# Altium footprint library SMT.PcbLib: 379 footprints (part 4 of 24)
Each footprint in its own frame and in the unit in brackets; x right, y up, seen from the top. Pads: shape width x height; smd on the part's side, far side on the other; paste and mask are expansions set on the pad; w line width, h text height; cw(c..) or ccw(c..) is an arc to the next point about the centre after c.
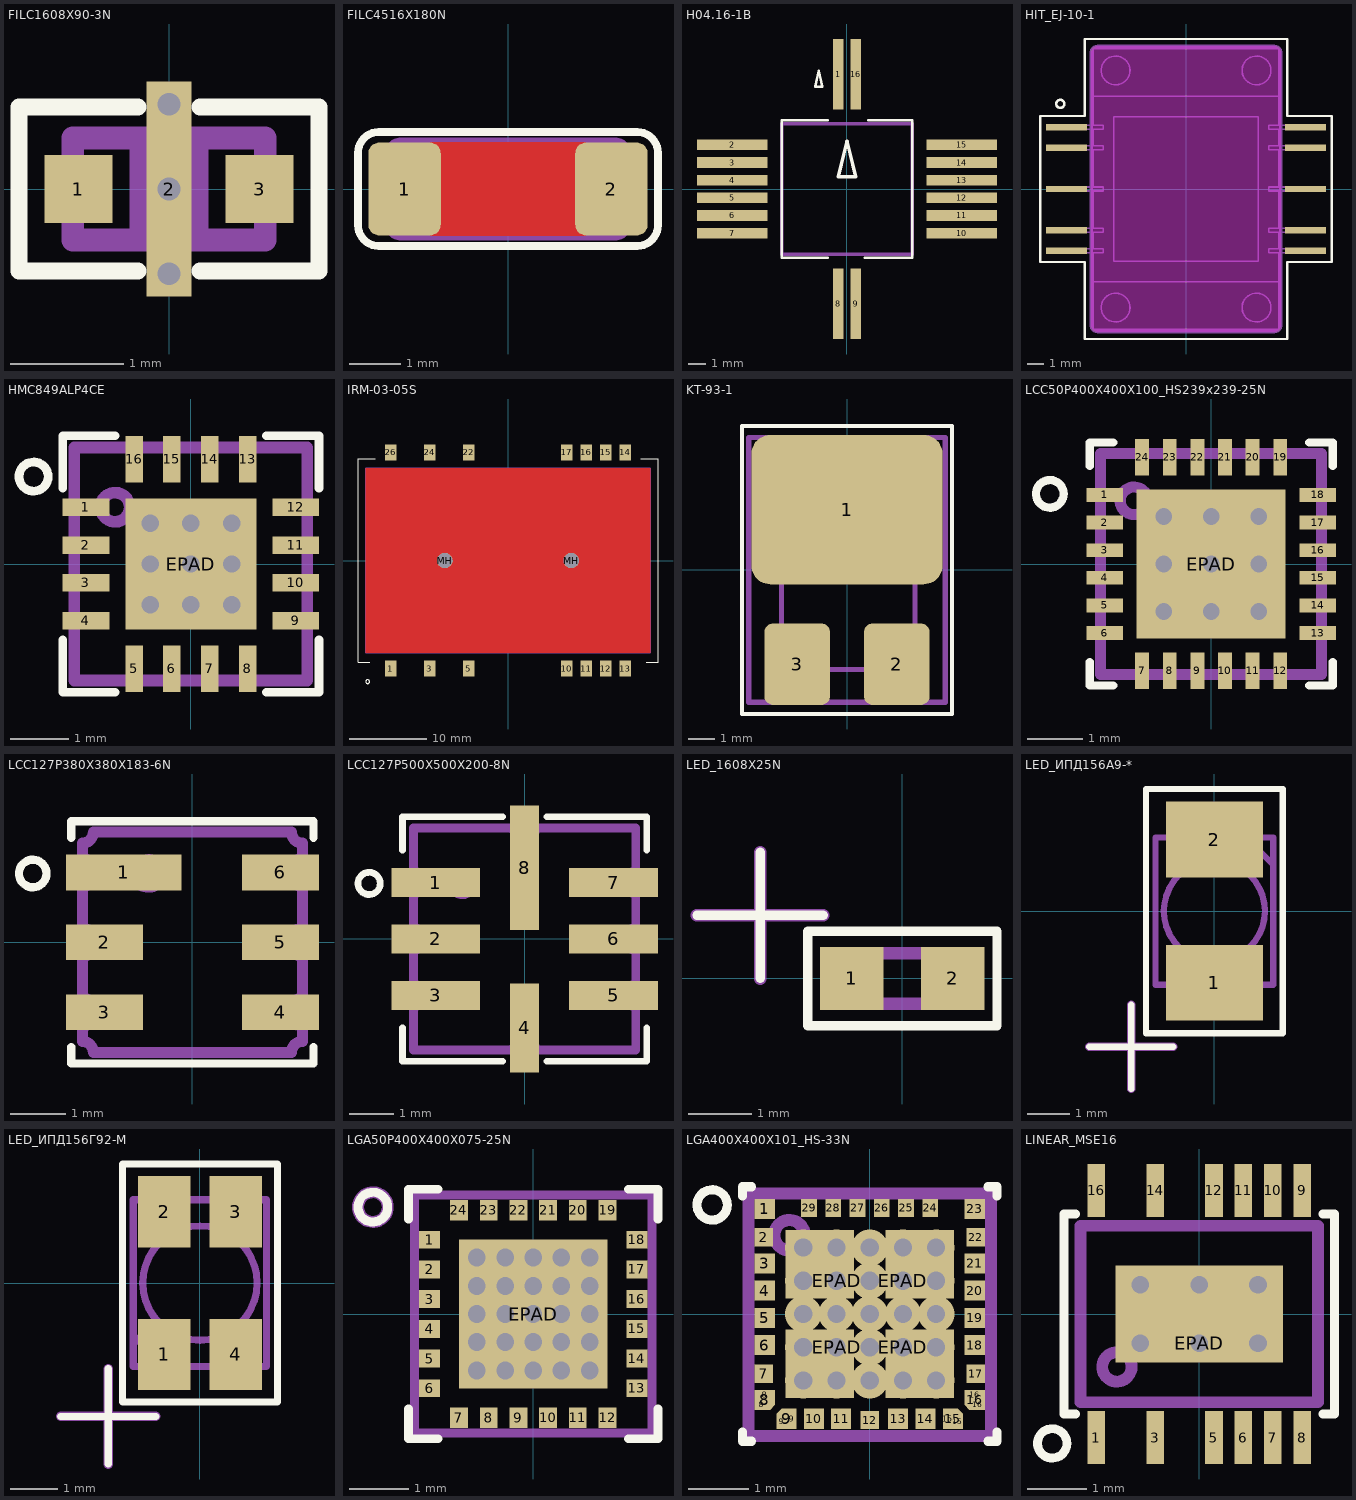
[diagram p3: the footprints below, top view; thin cyan lines are the x and y axes]

## FILC1608X90-3N [mm] "3-Lead SMD (0603); Body: L=1.6mm, W=0.8mm, H=0.9mm; Weight: ~0.01g; Фильтр"
height 0.9
pads (3):
  rect 0.6x0.6 smd paste+0 mask+0.1: 1(-0.8,0) 3(0.8,0)
  rect 0.4x1.9 smd paste-20: 2(0,0)
via 0,0 diameter 0.4 hole 0.2
via 0,0.75 diameter 0.4 hole 0.2
via 0,-0.75 diameter 0.4 hole 0.2
Top Overlay:
  lines w0.15: -0.275,-0.725 -1.325,-0.725 -1.325,0.725 -0.275,0.725 ; 0.275,-0.725 1.325,-0.725 1.325,0.725 0.275,0.725
Top Paste:
  rectangle: -0.2,-0.6 0.2,-0.2
  rectangle: -0.2,0.2 0.2,0.6
Top Solder:
  rectangle: -0.25,-0.6 0.25,-0.2
  rectangle: -0.25,0.2 0.25,0.6
Mechanical 1:
  lines w0.2: -0.25,-0.45 -0.25,0.45 ; 0.25,-0.45 0.25,0.45 ; -0.85,-0.45 0.85,-0.45 0.85,0.45 -0.85,0.45 -0.85,-0.45
3D body "Filter FILC1608X90-3N.stp": height 0.9, standoff 0, extent -0.85,-0.45 0.85,0.45

## FILC4516X180N [mm] "SMD; Body: 4,5x1,6x1,6; Фильтр помехоподавляющий"
height 1.8
pads (2):
  rrect30% 1.4x1.8 smd: 1(-2,0) 2(2,0)
Top Layer:
  pour cut-out: -1.5,0.9 1.5,0.9 1.5,-0.9 -1.5,-0.9
Top Overlay:
  lines w0.15: -2.9,-0.7 ccw(c-2.5,-0.7) -2.5,-1.1 2.5,-1.1 ccw(c2.5,-0.7) 2.9,-0.7 2.9,0.7 ccw(c2.5,0.7) 2.5,1.1 -2.5,1.1 ccw(c-2.5,0.7) -2.9,0.7 -2.9,-0.7
Mechanical 1:
  lines w0.2: -2.3,-0.65 ccw(c-2.05,-0.65) -2.05,-0.9 2.05,-0.9 ccw(c2.05,-0.65) 2.3,-0.65 2.3,0.65 ccw(c2.05,0.65) 2.05,0.9 -2.05,0.9 ccw(c-2.05,0.65) -2.3,0.65 -2.3,-0.65
3D body "Фильтр BLM41P (MuRata).STEP": height 1.6, standoff 0, extent -2.25,-0.8 2.25,0.8

## H04.16-1B [mm]
height 3
pads (16):
  rect 0.6x4 smd: 1(-0.5,6.5) 8(-0.5,-6.5) 9(0.5,-6.5) 16(0.5,6.5)
  rect 4x0.6 smd: 2(-6.5,2.5) 3(-6.5,1.5) 4(-6.5,0.5) 5(-6.5,-0.5) 6(-6.5,-1.5) 7(-6.5,-2.5) 10(6.5,-2.5) 11(6.5,-1.5) 12(6.5,-0.5) 13(6.5,0.5) 14(6.5,1.5) 15(6.5,2.5)
Top Overlay:
  lines w0.15: -1.1,-3.9 -3.7,-3.9 -3.7,3.9 -1.1,3.9 ; 1,-3.9 3.7,-3.9 3.7,3.9 1.2,3.9 ; -1.8,5.8 -1.4,5.8 -1.6,6.7 -1.8,5.8
  lines w0.2: -0.5,0.7 0,2.7 0.5,0.7 -0.5,0.7
Mechanical 1:
  lines w0.2: -3.7,-3.7 -3.7,3.7 3.7,3.7 3.7,-3.7 -3.7,-3.7
3D body "Н04.16-1В.STEP": height 2.93, standoff 0.01, extent -7.84,-8 7.84,8

## HIT_EJ-10-1 [mm] "10-Lead Ceramic Leaded Chip Carrier"
height 3
pads (10):
  rect 2.54x0.4 smd: 1(-7.366,3.81) 2(-7.366,2.54) 3(-7.366,0) 4(-7.366,-2.54) 5(-7.366,-3.81) 6(7.366,-3.81) 7(7.366,-2.54) 8(7.366,0) 9(7.366,2.54) 10(7.366,3.81)
Top Overlay:
  circle w0.15: c-7.75,5.25 r0.25
  lines w0.15: -9,-4.5 -6.25,-4.5 -6.25,-9.25 6.25,-9.25 6.25,-4.5 9,-4.5 9,4.5 6.25,4.5 6.25,9.25 -6.25,9.25 -6.25,4.5 -9,4.5 -9,-4.5
Keep-Out Layer:
  board cut-out: -5.85,-8.4 -5.85,8.4 -5.85,8.48 -5.789,8.627 -5.677,8.739 -5.53,8.8 -5.45,8.8 5.45,8.8 5.53,8.8 5.677,8.739 5.789,8.627 5.85,8.48 5.85,8.4 5.85,-8.4 5.85,-8.48 5.789,-8.627 5.677,-8.739 5.53,-8.8 5.45,-8.8 -5.45,-8.8 -5.53,-8.8 -5.677,-8.739 -5.789,-8.627 -5.85,-8.48
Mechanical 1:
  circle w0.1: c4.345,7.315 r0.889
  circle w0.1: c-4.345,7.315 r0.889
  circle w0.1: c4.345,-7.315 r0.889
  circle w0.1: c-4.345,-7.315 r0.889
  lines w0.1: -5.715,-3.937 -5.715,-5.71 ; -5.715,-3.683 -5.715,-2.667 ; -5.715,-2.413 -5.715,-0.127 ; -5.715,0.127 -5.715,2.413 ; -5.715,2.667 -5.715,3.683 ; -5.715,3.937 -5.715,5.71 ; 5.715,-3.937 5.715,-5.71 ; 5.715,-3.683 5.715,-2.667 ; 5.715,-2.413 5.715,-0.127 ; 5.715,0.127 5.715,2.413 ; 5.715,2.667 5.715,3.683 ; 5.715,3.937 5.715,5.71 ; -5.715,-5.71 -5.715,-8.66 5.715,-8.66 5.715,-5.71 ; -5.715,-5.71 5.715,-5.71 ; -5.715,5.71 -5.715,8.66 5.715,8.66 5.715,5.71 ; -5.715,5.71 5.715,5.71 ; -8.255,-3.937 -5.111,-3.937 -5.111,-3.683 -8.255,-3.683 -8.255,-3.937 ; -8.255,-2.667 -8.255,-2.413 -5.111,-2.413 -5.111,-2.667 -8.255,-2.667 ; -8.255,-0.127 -8.255,0.127 -5.111,0.127 -5.111,-0.127 -8.255,-0.127 ; -8.255,2.413 -5.111,2.413 -5.111,2.667 -8.255,2.667 -8.255,2.413 ; -8.255,3.683 -8.255,3.937 -5.111,3.937 -5.111,3.683 -8.255,3.683 ; -4.45,-4.45 4.45,-4.45 4.45,4.45 -4.45,4.45 -4.45,-4.45 ; 5.111,-3.937 8.255,-3.937 8.255,-3.683 5.111,-3.683 5.111,-3.937 ; 5.111,-2.667 8.255,-2.667 8.255,-2.413 5.111,-2.413 5.111,-2.667 ; 5.111,-0.127 5.111,0.127 8.255,0.127 8.255,-0.127 5.111,-0.127 ; 5.111,2.413 8.255,2.413 8.255,2.667 5.111,2.667 5.111,2.413 ; 5.111,3.683 5.111,3.937 8.255,3.937 8.255,3.683 5.111,3.683
Mechanical 2:
  lines w0.2: 5.45,-8.8 ccw(c5.45,-8.4) 5.85,-8.4 5.85,8.4 ccw(c5.45,8.4) 5.45,8.8 -5.45,8.8 ccw(c-5.45,8.4) -5.85,8.4 -5.85,-8.4 ccw(c-5.45,-8.4) -5.45,-8.8 5.45,-8.8 ; 5.45,-8.8 5.45,-8.8
Mechanical 8:
  text "Необходим теплоотвод. / См. EVALUATION BOARD" at 2.25,-6.25 h1.52
3D body "EJ-10-1.stp": height 2.34, standoff -0.64, extent -8.155,-8.56 8.355,8.76

## HMC849ALP4CE [mm] "16 Lead 4x4 mm QFN Package: 16 mm?"
height 1
pads (17):
  rect 0.8x0.3 smd mask+0.05: 1(-1.8,0.975) 2(-1.8,0.325) 3(-1.8,-0.325) 4(-1.8,-0.975) 9(1.8,-0.975) 10(1.8,-0.325) 11(1.8,0.325) 12(1.8,0.975)
  rect 0.3x0.8 smd mask+0.05: 5(-0.975,-1.8) 6(-0.325,-1.8) 7(0.325,-1.8) 8(0.975,-1.8) 13(0.975,1.8) 14(0.325,1.8) 15(-0.325,1.8) 16(-0.975,1.8)
  rect 2.25x2.25 hole 0.3 mask+0.05: EPAD(0,0)
via -0.7,0 diameter 0.7 hole 0.3
via 0.7,0 diameter 0.7 hole 0.3
via -0.7,0.7 diameter 0.7 hole 0.3
via -0.7,-0.7 diameter 0.7 hole 0.3
via 0.7,0.7 diameter 0.7 hole 0.3
via 0.7,-0.7 diameter 0.7 hole 0.3
via 0,-0.7 diameter 0.7 hole 0.3
via 0,0.7 diameter 0.7 hole 0.3
Top Overlay:
  circle w0.15: c-2.7,1.5 r0.25
  lines w0.15: -2.2,-1.3 -2.2,-2.2 -1.3,-2.2 ; -2.2,1.3 -2.2,2.2 -1.3,2.2 ; 1.3,-2.2 2.2,-2.2 2.2,-1.3 ; 1.3,2.2 2.2,2.2 2.2,1.3
Top Paste:
  rectangle: -0.975,0.1 -0.1,1
  region: 0.975,1 0.1,1 0.1,0.1 0.975,0.1
  region: 0.975,-0.1 0.1,-0.1 0.1,-1 0.975,-1
  rectangle: -0.975,-1 -0.1,-0.1
Mechanical 1:
  circle w0.2: c-1.3,0.975 r0.25
  lines w0.2: -2,-2 -2,2 2,2 2,-2 -2,-2
3D body "User Library-qfn16-4x4with pad.STEP": height 0.92, standoff 0, extent -2,-2 2,2

## IRM-03-05S [mm]
height 16
pads (16):
  rect 1.5x2.1 smd mask+0.05: 1(-15.24,-14.05) 3(-10.16,-14.05) 5(-5.08,-14.05) 10(7.62,-14.05) 11(10.16,-14.05) 12(12.7,-14.05) 13(15.24,-14.05) 14(15.24,14.05) 15(12.7,14.05) 16(10.16,14.05) 17(7.62,14.05) 22(-5.08,14.05) 24(-10.16,14.05) 26(-15.24,14.05)
  round 2 hole 2 mask+0.05: MH(-8.22,0) MH(8.22,0)
Top Layer:
  pour cut-out: -18.5,12 -18.5,-12 18.5,-12 18.5,12
Top Overlay:
  circle w0.15: c-18.25,-15.75 r0.25
  lines w0.15: -18,-13.25 -19.5,-13.25 -19.5,13.25 -17.25,13.25 ; 17.25,13.25 19.5,13.25 19.5,-13.25 18,-13.25
Mechanical 1:
  circle w0.2: c-15,-10 r0.25
  lines w0.2: -18.5,-12 -18.5,12 18.5,12 18.5,-12 -18.5,-12
3D body "IRM03-SMD.stp": height 16, standoff 0, extent -18.5,-14.53 18.5,14.53

## KT-93-1 [mm]
height 3.2
pads (3):
  rrect25% 7.3x5.7 smd paste-1.5: 1(0,2.3)
  rrect25% 2.5x3.1 smd paste-0.5: 2(1.9,-3.6) 3(-1.9,-3.6)
Top Overlay:
  lines w0.15: -4,-5.5 4,-5.5 4,5.5 -4,5.5 -4,-5.5
Mechanical 1:
  circle w0.2: c0,2.5 r0.25
  lines w0.2: -3.75,-5.05 -3.75,5.05 3.75,5.05 3.75,-5.05 -3.75,-5.05 ; -2.5,-3.8 2.6,-3.8 2.6,3.8 -2.5,3.8 -2.5,-3.8
3D body "КТ-93-1.STEP": height 3.16, standoff 0.01, extent -3.75,-5.05 3.75,5.05

## LCC50P400X400X100_HS239x239-25N [mm] "LCC, 24-Leads, Body 4,00x4,00mm, Pitch 0,50mm, Thermal Pad 2,4x2,4mm, IPC Medium Density"
height 1
pads (25):
  rect 0.66x0.25 smd paste-0.025 mask+0.03: 1(-1.93,1.25) 2(-1.93,0.75) 3(-1.93,0.25) 4(-1.93,-0.25) 5(-1.93,-0.75) 6(-1.93,-1.25) 13(1.93,-1.25) 14(1.93,-0.75) 15(1.93,-0.25) 16(1.93,0.25) 17(1.93,0.75) 18(1.93,1.25)
  rect 0.25x0.66 smd paste-0.025 mask+0.03: 7(-1.25,-1.93) 8(-0.75,-1.93) 9(-0.25,-1.93) 10(0.25,-1.93) 11(0.75,-1.93) 12(1.25,-1.93) 19(1.25,1.93) 20(0.75,1.93) 21(0.25,1.93) 22(-0.25,1.93) 23(-0.75,1.93) 24(-1.25,1.93)
  rect 2.7x2.7 hole 0.3 paste-1 mask-0.1: EPAD(0,0)
via -0.86,0 diameter 0.7 hole 0.3
via 0,-0.86 diameter 0.7 hole 0.3
via 0.86,0 diameter 0.7 hole 0.3
via 0,0.86 diameter 0.7 hole 0.3
via -0.86,0.86 diameter 0.7 hole 0.3
via 0.86,0.86 diameter 0.7 hole 0.3
via -0.86,-0.86 diameter 0.7 hole 0.3
via 0.86,-0.86 diameter 0.7 hole 0.3
Top Overlay:
  circle w0.15: c-2.921,1.27 r0.25
  lines w0.15: -2.2,-1.775 -2.2,-2.2 -1.775,-2.2 ; -2.2,1.775 -2.2,2.2 -1.775,2.2 ; 1.775,-2.2 2.2,-2.2 2.2,-1.775 ; 1.775,2.2 2.2,2.2 2.2,1.775
Top Paste:
  region: -1.2,1.2 -1.2,-1.2 1.2,-1.2 1.2,1.2
Mechanical 1:
  circle w0.2: c-1.397,1.143 r0.25
  lines w0.2: -2,-2 -2,2 2,2 2,-2 -2,-2
3D body "QFN24-4X4.STEP": height 0.92, standoff 0.02, extent -2,-2 2,2

## LCC127P380X380X183-6N [mm] "LCC, 6-Pins, Body 3,80x3,80mmx1,83mm, Pitch 1,27mm, IPC Medium Density"
height 1.83
pads (6):
  rect 2.1x0.65 smd: 1(-1.25,1.27)
  rect 1.4x0.65 smd: 2(-1.6,0) 3(-1.6,-1.27) 4(1.6,-1.27) 5(1.6,0) 6(1.6,1.27)
Top Overlay:
  circle w0.15: c-2.9,1.25 r0.25
  lines w0.15: -2.2,-1.9 -2.2,-2.2 2.2,-2.2 2.2,-1.9 ; -2.2,1.9 -2.2,2.2 2.2,2.2 2.2,1.9
Mechanical 1:
  circle w0.2: c-0.8,1.25 r0.25
  lines w0.2: -2,-1.8 cw(c-2,-2) -1.8,-2 1.8,-2 cw(c2,-2) 2,-1.8 2,-1.52 cw(c2,-1.27) 2,-1.02 2,-0.25 cw(c2,0) 2,0.25 2,1.02 cw(c2,1.27) 2,1.52 2,1.8 cw(c2,2) 1.8,2 -1.8,2 cw(c-2,2) -2,1.8 -2,1.52 cw(c-2,1.27) -2,1.02 -2,0.25 cw(c-2,0) -2,-0.25 -2,-1.02 cw(c-2,-1.27) -2,-1.52 -2,-1.8
3D body "LCC127P380X380X183-6N.stp": height 1.85, standoff 0.01, extent -2,-2 2,2

## LCC127P500X500X200-8N [mm] "LCC, 12-Pins, Body 5,00x5,00mmx2,00mm, Pitch 1,27mm, IPC Medium Density"
height 2
pads (8):
  rect 2x0.65 smd: 1(-2,1.27) 2(-2,0) 3(-2,-1.27) 5(2,-1.27) 6(2,0) 7(2,1.27)
  rect 0.65x2 smd: 4(0,-2)
  rect 0.65x2.8 smd: 8(0,1.6)
Top Overlay:
  circle w0.15: c-3.5,1.25 r0.25
  lines w0.15: -2.75,-2 -2.75,-2.75 -0.5,-2.75 ; -2.75,2 -2.75,2.75 -0.5,2.75 ; 0.5,-2.75 2.75,-2.75 2.75,-2 ; 0.5,2.75 2.75,2.75 2.75,2
Mechanical 1:
  circle w0.2: c-1.4,1.25 r0.25
  lines w0.2: -2.5,-2.5 -0.25,-2.5 cw(c0,-2.5) 0.25,-2.5 2.5,-2.5 2.5,-1.52 cw(c2.5,-1.27) 2.5,-1.02 2.5,-0.25 cw(c2.5,0) 2.5,0.25 2.5,1.02 cw(c2.5,1.27) 2.5,1.52 2.5,2.5 0.25,2.5 cw(c0,2.5) -0.25,2.5 -2.5,2.5 -2.5,1.52 cw(c-2.5,1.27) -2.5,1.02 -2.5,0.25 cw(c-2.5,0) -2.5,-0.25 -2.5,-1.02 cw(c-2.5,-1.27) -2.5,-1.52 -2.5,-2.5
3D body "QLCC 6-8.stp": height 1.92, standoff 0.02, extent -2.5,-2.5 2.5,2.5

## LED_1608X25N [mm] "Chip LED lamp, 2-Leads, Body 1,60x0,80mm, IPC Medium Density"
height 0.25
pads (2):
  rect 1x1 smd: 1(-0.8,0) 2(0.8,0)
Top Overlay:
  lines w0.15: -3.25,1 -1.25,1 ; -2.25,0 -2.25,2 ; -1.5,-0.75 1.5,-0.75 1.5,0.75 -1.5,0.75 -1.5,-0.75
Mechanical 1:
  lines w0.2: -3.25,1 -1.25,1 ; -2.25,0 -2.25,2 ; -0.8,-0.4 0.8,-0.4 0.8,0.4 -0.8,0.4 -0.8,-0.4
3D body "cled.STEP": height 0.62, standoff 0.02, extent -0.8,-0.4 0.8,0.4

## LED_ИПД156А9-* [mm] "PLCC-2 3528"
height 2
pads (2):
  rect 2.3x1.8 smd paste-0.05 mask+0.05: 1(0,-1.7) 2(0,1.7)
Top Overlay:
  lines w0.15: -2.975,-3.225 -0.975,-3.225 ; -1.975,-4.225 -1.975,-2.225 ; -1.625,-2.9 1.625,-2.9 1.625,2.9 -1.625,2.9 -1.625,-2.9
Mechanical 1:
  circle w0.15: c0,0 r1.2
  lines w0.15: 0.75,1.75 1.4,1.103 ; -1.4,-1.75 1.4,-1.75 1.4,1.75 -1.4,1.75 -1.4,-1.75
  lines w0.2: -2.975,-3.225 -0.975,-3.225 ; -1.975,-4.225 -1.975,-2.225
Mechanical 20:
  text "Возможно / нужен / теплоотвод" at -2.175,3.825 h1.5
3D body "LED_PLCC2_3528.stp": height 1.91, standoff 0, extent -1.4,-1.75 1.4,1.75

## LED_ИПД156Г92-М [mm] "PLCC-4 3528"
height 1.9
pads (4):
  rect 1.1x1.5 smd paste-0.05 mask+0.05: 1(-0.75,-1.5) 2(-0.75,1.5) 3(0.75,1.5) 4(0.75,-1.5)
Top Overlay:
  lines w0.15: -2.925,-2.8 -0.925,-2.8 ; -1.925,-3.8 -1.925,-1.8 ; -1.625,-2.5 -1.625,2.5 1.625,2.5 1.625,-2.5 -1.625,-2.5
Mechanical 1:
  circle w0.15: c0,0 r1.2
  lines w0.15: -1.4,-1.103 -0.75,-1.75 ; -1.4,-1.75 -1.4,1.75 1.4,1.75 1.4,-1.75 -1.4,-1.75
  lines w0.2: -2.925,-2.8 -0.925,-2.8 ; -1.925,-3.8 -1.925,-1.8
Mechanical 20:
  text "Возможно / нужен / теплоотвод" at -2.175,3.825 h1.5
3D body "LED_PLCC4_3528.stp": height 1.9, standoff 0, extent -1.4,-1.75 1.4,1.75

## LGA50P400X400X075-25N [mm] "Body:4.00х4.00х0.75mm; Pitch 0.5mm; 24-Leads; Thermal Pad 2.5x2.5"
height 0.85
pads (25):
  rect 0.35x0.3 smd paste+0 mask+0.04: 1(-1.745,1.25) 6(-1.745,-1.25) 13(1.745,-1.25) 18(1.745,1.25)
  rect 0.35x0.3 smd paste+0 mask+0.05: 2(-1.745,0.75) 3(-1.745,0.25) 4(-1.745,-0.25) 5(-1.745,-0.75) 14(1.745,-0.75) 15(1.745,-0.25) 16(1.745,0.25) 17(1.745,0.75)
  rect 0.3x0.35 smd paste+0 mask+0.04: 7(-1.25,-1.745) 12(1.25,-1.745) 19(1.25,1.745) 24(-1.25,1.745)
  rect 0.3x0.35 smd paste+0 mask+0.05: 8(-0.75,-1.745) 9(-0.25,-1.745) 10(0.25,-1.745) 11(0.75,-1.745) 20(0.75,1.745) 21(0.25,1.745) 22(-0.25,1.745) 23(-0.75,1.745)
  rect 2.5x2.5 hole 0.3 mask+0.05: EPAD(0,0)
via -0.95,0 diameter 0.6 hole 0.3
via -0.47,0 diameter 0.6 hole 0.3
via 0,-0.47 diameter 0.6 hole 0.3
via 0,-0.95 diameter 0.6 hole 0.3
via 0.47,0 diameter 0.6 hole 0.3
via 0.95,0 diameter 0.6 hole 0.3
via 0,0.47 diameter 0.6 hole 0.3
via 0,0.95 diameter 0.6 hole 0.3
via -0.47,0.47 diameter 0.6 hole 0.3
via -0.95,0.47 diameter 0.6 hole 0.3
via -0.47,0.95 diameter 0.6 hole 0.3
via -0.95,0.95 diameter 0.6 hole 0.3
via -0.47,-0.47 diameter 0.6 hole 0.3
via -0.95,-0.47 diameter 0.6 hole 0.3
via -0.47,-0.95 diameter 0.6 hole 0.3
via -0.95,-0.95 diameter 0.6 hole 0.3
via 0.47,-0.47 diameter 0.6 hole 0.3
via 0.95,-0.47 diameter 0.6 hole 0.3
via 0.47,-0.95 diameter 0.6 hole 0.3
via 0.95,-0.95 diameter 0.6 hole 0.3
via 0.47,0.47 diameter 0.6 hole 0.3
via 0.95,0.47 diameter 0.6 hole 0.3
via 0.47,0.95 diameter 0.6 hole 0.3
via 0.95,0.95 diameter 0.6 hole 0.3
Top Overlay:
  circle w0.15: c-2.7,1.8 r0.25
  lines w0.15: -2.1,-1.6 -2.1,-2.1 -1.6,-2.1 ; -2.1,1.6 -2.1,2.1 -1.6,2.1 ; 1.6,-2.1 2.1,-2.1 2.1,-1.6 ; 1.6,2.1 2.1,2.1 2.1,1.6
Top Paste:
  rectangle: -1.25,0.15 -0.15,1.25
  region: -0.15,-1.25 -0.15,-0.15 -1.25,-0.15 -1.25,-1.25
  region: 1.25,-0.15 0.15,-0.15 0.15,-1.25 1.25,-1.25
  region: 0.15,1.25 0.15,0.15 1.25,0.15 1.25,1.25
Mechanical 1:
  circle w0.2: c-2.7,1.8 r0.25
  lines w0.15: -2,-2 2,-2 2,2 -2,2 -2,-2
Mechanical 20:
  text "В pdf есть рекомендации  / разводки" at -8.54,2.564 h1.4
3D body "Микросхема ADRF5730.stp": height 0.75, standoff -0.01, extent -2.05,-2.05 2.05,2.05

## LGA400X400X101_HS-33N [mm] "LGA, 29-Leads, Body 4,00x4,00mm, Variable pitch, Thermal Pad 3,85x3,08mm, IPC Medium Density"
height 1.01
pads (41):
  rect 0.34x0.33 smd paste+0 mask+0.04: 1(-1.73,1.735) 3(-1.73,0.835) 4(-1.73,0.385) 5(-1.73,-0.065) 6(-1.73,-0.515) 18(1.73,-0.515) 19(1.73,-0.065) 20(1.73,0.385) 21(1.73,0.835) 23(1.73,1.735)
  rect 0.3x0.3 smd paste+0 mask+0.04: 2(-1.75,1.265) 7(-1.75,-0.985) 12(0,-1.75) 17(1.75,-0.985) 22(1.75,1.265)
  rect 0.242x0.16 smd paste+0 mask+0.04: 8(-1.779,-1.5) 16(1.779,-1.5)
  oct 0.34x0.33 smd paste+0 mask+0.04: 8(-1.73,-1.415) 16(1.73,-1.415)
  rect 0.34x0.17 smd paste+0 mask+0.04: 8(-1.73,-1.335) 16(1.73,-1.335)
  rect 0.16x0.242 smd paste+0 mask+0.04: 9(-1.455,-1.779) 15(1.455,-1.779)
  oct 0.33x0.34 smd paste+0 mask+0.04: 9(-1.37,-1.73) 15(1.37,-1.73)
  rect 0.17x0.34 smd paste+0 mask+0.04: 9(-1.29,-1.73) 15(1.29,-1.73)
  rect 0.33x0.34 smd paste+0 mask+0.04: 10(-0.92,-1.73) 11(-0.47,-1.73) 13(0.47,-1.73) 14(0.92,-1.73)
  rect 0.26x0.3 smd paste+0 mask+0.04: 24(1,1.75) 25(0.6,1.75) 26(0.2,1.75) 27(-0.2,1.75) 28(-0.6,1.75) 29(-1,1.75)
  rect 1.13x1.13 hole 0.3 copper offset -0.274,-0.274 mask+0.05: EPAD(-0.548,-0.548)
  rect 1.13x1.13 hole 0.3 copper offset -0.274,0.274 mask+0.05: EPAD(-0.548,0.548)
  rect 1.13x1.13 hole 0.3 copper offset 0.274,-0.274 mask+0.05: EPAD(0.548,-0.548)
  rect 1.13x1.13 hole 0.3 copper offset 0.274,0.274 mask+0.05: EPAD(0.548,0.548)
via 0,0 diameter 0.6 hole 0.3
via 0,0.548 diameter 0.6 hole 0.3
via 0,1.096 diameter 0.6 hole 0.3
via 0.548,0 diameter 0.6 hole 0.3
via 1.096,0 diameter 0.6 hole 0.3
via -0.548,0 diameter 0.6 hole 0.3
via -1.096,0 diameter 0.6 hole 0.3
via 0,-0.548 diameter 0.6 hole 0.3
via 0,-1.096 diameter 0.6 hole 0.3
via 0.548,1.096 diameter 0.6 hole 0.3
via 1.096,1.096 diameter 0.6 hole 0.3
via 1.096,0.548 diameter 0.6 hole 0.3
via 1.096,-0.548 diameter 0.6 hole 0.3
via 1.096,-1.096 diameter 0.6 hole 0.3
via 0.548,-1.096 diameter 0.6 hole 0.3
via -0.548,-1.096 diameter 0.6 hole 0.3
via -1.096,-1.096 diameter 0.6 hole 0.3
via -1.096,-0.548 diameter 0.6 hole 0.3
via -1.096,0.548 diameter 0.6 hole 0.3
via -1.096,1.096 diameter 0.6 hole 0.3
via -0.548,1.096 diameter 0.6 hole 0.3
Top Overlay:
  circle w0.15: c-2.6,1.8 r0.25
  lines w0.15: -2.1,-1.95 -2.1,-2.1 -1.95,-2.1 ; -2.1,1.95 -2.1,2.1 -1.95,2.1 ; 1.95,-2.1 2.1,-2.1 2.1,-1.95 ; 1.95,2.1 2.1,2.1 2.1,1.95
Top Paste:
  region: -0.24,1.37 -1.37,1.37 -1.37,0.24 -0.24,0.24
  rectangle: 0.24,0.24 1.37,1.37
  rectangle: 0.24,-1.37 1.37,-0.24
  region: -0.24,-0.24 -1.37,-0.24 -1.37,-1.37 -0.24,-1.37
Mechanical 1:
  circle w0.2: c-1.325,1.3 r0.25
  lines w0.2: -2,-2.01 2,-2.01 2,1.99 -2,1.99 -2,-2.01
Mechanical 20:
  text "от 12ГГц рек-и по  / прошивке см. в datasheet / SP4T Evaluation Board" at -3.9,3.3 h1.2
3D body "PE42542.stp": height 1.11, standoff 0, extent -2,-2 2,2

## LINEAR_MSE16 [mm] "16-Lead Plastic MSOP with 4 Pins Removed"
height 1.1
pads (13):
  rect 0.3x0.9 smd mask+0.05: 1(-1.75,-2.1) 3(-0.75,-2.1) 5(0.25,-2.1) 6(0.75,-2.1) 7(1.25,-2.1) 8(1.75,-2.1) 9(1.75,2.1) 10(1.25,2.1) 11(0.75,2.1) 12(0.25,2.1) 14(-0.75,2.1) 16(-1.75,2.1)
  rect 2.845x1.65 hole 0.3 copper offset 0,0.5: EPAD(0,-0.5)
via 0,0.5 diameter 0.6 hole 0.3
via 1,0.5 diameter 0.6 hole 0.3
via -1,0.5 diameter 0.6 hole 0.3
via -1,-0.5 diameter 0.6 hole 0.3
via 1,-0.5 diameter 0.6 hole 0.3
Top Overlay:
  circle w0.15: c-2.5,-2.2 r0.25
  lines w0.15: -2.1,-1.7 -2.3,-1.7 -2.3,-1.1 -2.3,1.7 -2.1,1.7 ; 2.1,-1.7 2.3,-1.7 2.3,1.7 2.1,1.7
Top Paste:
  rectangle: -1.3,-0.7 1.3,0.7
Mechanical 1:
  circle w0.2: c-1.4,-0.9 r0.25
  lines w0.2: -2.02,-1.5 -2.02,1.5 2.02,1.5 2.02,-1.5 -2.02,-1.5
3D body "User Library-MSE16(12).STEP": height 0.87, standoff 0.01, extent -2.02,-2.45 2.019,2.45